# Altium footprint library ref-packages.PCBLIB: 1544 footprints (part 28 of 103)
Each footprint in its own frame and in the unit in brackets; x right, y up, seen from the top. Pads: shape width x height; smd on the part's side, far side on the other; paste and mask are expansions set on the pad; w line width, h text height; cw(c..) or ccw(c..) is an arc to the next point about the centre after c.
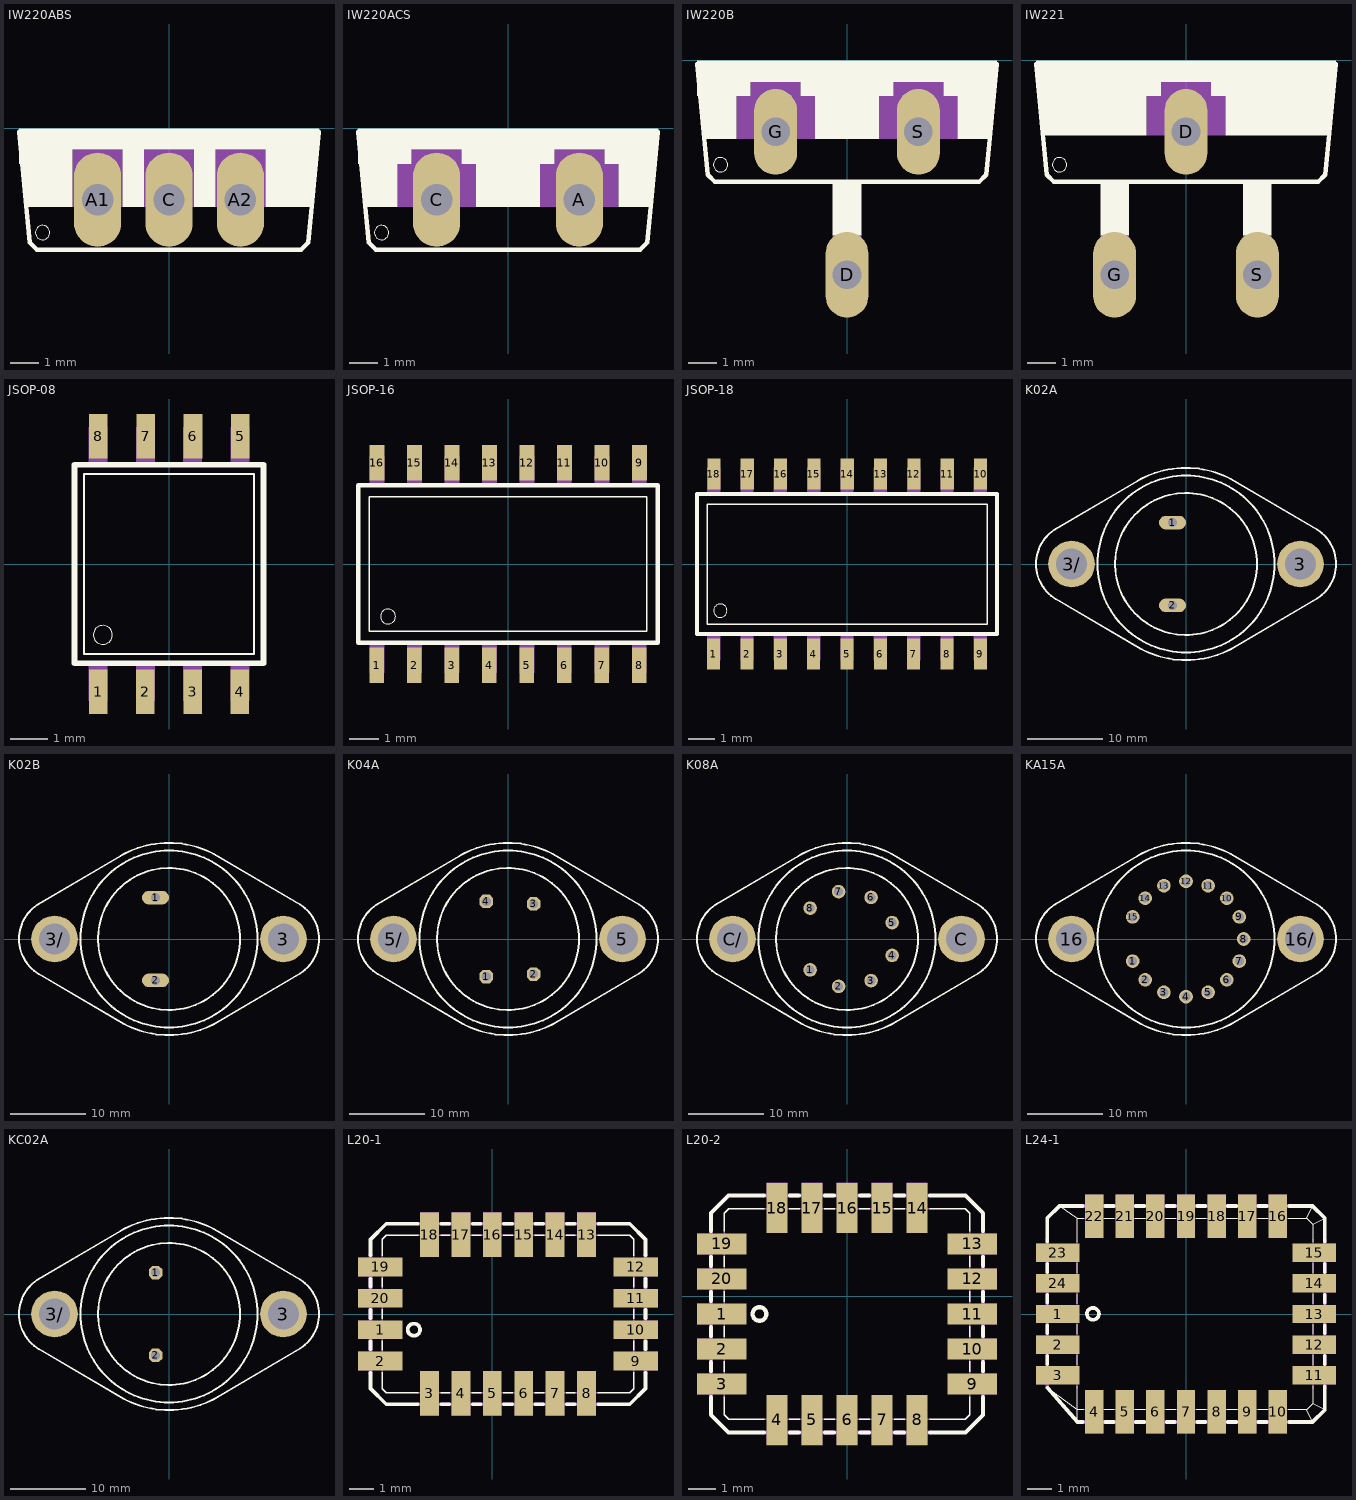
[diagram p27: the footprints below, top view; thin cyan lines are the x and y axes]

## IW220ABS [mil]
pads (3):
  oval 66x132 hole 44: A1(-100,-100) A2(100,-100) C(0,-100)
Top Overlay:
  circle w0: c-177,-146 r10
  rectangle: -210,-30 210,0
  rectangle: -210,-50 -135,-30
  rectangle: 135,-50 205,-30
  rectangle: 200,-75 205,-50
  rectangle: -205,-75 -200,-50
  rectangle: 135,-110 200,-50
  rectangle: 35,-110 65,-30
  rectangle: -65,-110 -35,-30
  rectangle: -200,-110 -135,-50
  lines w6: -210,-5 -195,-160 -185,-170 185,-170 195,-160 210,-5
Mechanical 16:
  rectangle: 65,-110 135,-30
  rectangle: -35,-110 35,-30
  rectangle: -135,-110 -65,-30

## IW220ACS [mil]
pads (2):
  oval 66x132 hole 44: A(100,-100) C(-100,-100)
Top Overlay:
  circle w0: c-177,-146 r10
  rectangle: -210,-30 210,0
  rectangle: -210,-50 -135,-30
  rectangle: -65,-50 65,-30
  rectangle: 155,-110 200,-50
  rectangle: 135,-50 205,-30
  rectangle: 200,-75 205,-50
  rectangle: -45,-110 45,-50
  rectangle: -200,-110 -155,-50
  rectangle: -205,-75 -200,-50
  lines w6: -210,-5 -195,-160 -185,-170 185,-170 195,-160 210,-5
Mechanical 16:
  rectangle: -135,-50 -65,-30
  rectangle: 65,-50 135,-30
  rectangle: 45,-110 155,-50
  rectangle: -155,-110 -45,-50

## IW220B [mil]
pads (3):
  oval 60x120 hole 40: D(0,-300) G(-100,-100) S(100,-100)
Top Overlay:
  circle w0: c-177,-146 r10
  rectangle: -210,-30 210,0
  rectangle: -210,-50 -135,-30
  rectangle: -20,-245 20,-170
  rectangle: -65,-50 65,-30
  rectangle: 155,-110 200,-50
  rectangle: 135,-50 205,-30
  rectangle: 200,-75 205,-50
  rectangle: -45,-110 45,-50
  rectangle: -200,-110 -155,-50
  rectangle: -205,-75 -200,-50
  lines w6: -210,-5 -195,-160 -185,-170 185,-170 195,-160 210,-5
Mechanical 16:
  rectangle: -135,-50 -65,-30
  rectangle: 65,-50 135,-30
  rectangle: -20,-300 20,-245
  rectangle: 45,-110 155,-50
  rectangle: -155,-110 -45,-50
  text "G" at -120,-160 h62
  text "D" at -15,-160 h62
  text "S" at 80,-160 h62

## IW221 [mil]
pads (3):
  oval 60x120 hole 40: D(0,-100) G(-100,-300) S(100,-300)
Top Overlay:
  circle w0: c-177,-146 r10
  rectangle: -210,-30 210,0
  rectangle: -120,-245 -80,-170
  rectangle: 80,-245 120,-170
  rectangle: 35,-50 205,-30
  rectangle: 55,-105 200,-50
  rectangle: -200,-105 -55,-50
  rectangle: -205,-50 -35,-30
  rectangle: 200,-80 205,-50
  rectangle: -205,-80 -200,-50
  lines w6: -210,-5 -195,-160 -185,-170 185,-170 195,-160 210,-5
Mechanical 16:
  rectangle: -35,-50 35,-30
  rectangle: -120,-300 -80,-245
  rectangle: 80,-300 120,-245
  rectangle: -55,-105 55,-50
  text "G" at -125,-160 h62
  text "D" at -15,-160 h62
  text "S" at 80,-160 h62

## JSOP-08 [mil]
pads (8):
  rect 19.69x47.24 smd: 1(-75,-135) 2(-25,-135) 3(25,-135) 4(75,-135) 5(75.32,135) 6(25.32,135) 7(-24.69,135) 8(-74.69,135)
Top Overlay:
  circle w0: c-70,-75 r10
  lines w2: -90,-95 90,-95 90,95 -90,95 -90,-95
  lines w6: -100,-105 -100,105 100,105 100,-105 -100,-105
Mechanical 16:
  rectangle: -85,105 -65,145
  rectangle: -35,105 -15,145
  rectangle: 15,105 35,145
  rectangle: 65,105 85,145
  rectangle: -85,-145 -65,-105
  rectangle: -35,-145 -15,-105
  rectangle: 15,-145 35,-105
  rectangle: 65,-145 85,-105

## JSOP-16 [mil]
pads (16):
  rect 19.69x47.24 smd: 1(-175,-135) 2(-125,-135) 3(-75,-135) 4(-25,-135) 5(25,-135) 6(75,-135) 7(125,-135) 8(175,-135) 9(175.32,135) 10(125.32,135) 11(75.32,135) 12(25.32,135) 13(-24.69,135) 14(-74.69,135) 15(-124.69,135) 16(-174.69,135)
Top Overlay:
  circle w0: c-160,-70 r10
  lines w2: -185,-90 185,-90 185,90 -185,90 -185,-90
  lines w6: -200,-105 -200,105 200,105 200,-105 -200,-105
Mechanical 16:
  rectangle: -185,105 -165,145
  rectangle: -135,105 -115,145
  rectangle: -85,105 -65,145
  rectangle: -35,105 -15,145
  rectangle: 15,105 35,145
  rectangle: 65,105 85,145
  rectangle: 115,105 135,145
  rectangle: 165,105 185,145
  rectangle: -185,-145 -165,-105
  rectangle: -135,-145 -115,-105
  rectangle: -85,-145 -65,-105
  rectangle: -35,-145 -15,-105
  rectangle: 15,-145 35,-105
  rectangle: 65,-145 85,-105
  rectangle: 115,-145 135,-105
  rectangle: 165,-145 185,-105

## JSOP-18 [mil]
pads (18):
  rect 19.69x47.24 smd: 1(-200,-135) 2(-150,-135) 3(-100,-135) 4(-50,-135) 5(0,-135) 6(50,-135) 7(100,-135) 8(150,-135) 9(200,-135) 10(200.32,135) 11(150.32,135) 12(100.32,135) 13(50.32,135) 14(0.32,135) 15(-49.69,135) 16(-99.69,135) 17(-149.69,135) 18(-199.69,135)
Top Overlay:
  circle w0: c-190,-70 r10
  lines w2: -210,-90 210,-90 210,90 -210,90 -210,-90
  lines w6: -225,-105 -225,105 225,105 225,-105 -225,-105
Mechanical 16:
  rectangle: -210,105 -190,145
  rectangle: -160,105 -140,145
  rectangle: -110,105 -90,145
  rectangle: -60,105 -40,145
  rectangle: -10,105 10,145
  rectangle: 40,105 60,145
  rectangle: 90,105 110,145
  rectangle: 140,105 160,145
  rectangle: 190,105 210,145
  rectangle: -210,-145 -190,-105
  rectangle: -160,-145 -140,-105
  rectangle: -110,-145 -90,-105
  rectangle: -60,-145 -40,-105
  rectangle: -10,-145 10,-105
  rectangle: 40,-145 60,-105
  rectangle: 90,-145 110,-105
  rectangle: 140,-145 160,-105
  rectangle: 190,-145 210,-105

## K02A [mil]
pads (4):
  oval 141x70.5 hole 47: 1(-70,215) 2(-70,-215)
  round 243 hole 162: 3(595,0) 3/(-595,0)
Top Overlay:
  circle w10: c0,0 r369
  circle w10: c0,0 r460
  lines w10: -680,180 -250,433 ; -679,-181 -234,-442 ; -675.41,-183.35 cw(c-567,0) -780,0 cw(c-567,0) -672.94,184.78 ; -250.86,432.52 cw(c-0.01,0) 0,500 cw(c0.01,-0.01) 235.3,441.18 ; -235.3,-441.18 ccw(c-0.01,0.01) 0,-500 ccw(c0.01,0) 250.86,-432.52 ; 235,441 684,178 ; 251,-433 684,-178 ; 682.54,-178.94 ccw(c567,0) 780,0 ccw(c567,0) 682.54,178.94
Mechanical 16:
  circle w10: c595,0 r85
  circle w10: c-595,0 r85

## K02B [mil]
pads (4):
  oval 141x70.5 hole 47: 1(-70,215) 2(-70,-215)
  round 243 hole 162: 3(595,0) 3/(-595,0)
Top Overlay:
  circle w10: c0,0 r369
  circle w10: c0,0 r460
  lines w10: -680,180 -250,433 ; -679,-181 -234,-442 ; -675.41,-183.35 cw(c-567,0) -780,0 cw(c-567,0) -672.94,184.78 ; -250.86,432.52 cw(c-0.01,0) 0,500 cw(c0.01,-0.01) 235.3,441.18 ; -235.3,-441.18 ccw(c-0.01,0.01) 0,-500 ccw(c0.01,0) 250.86,-432.52 ; 235,441 684,178 ; 251,-433 684,-178 ; 682.54,-178.94 ccw(c567,0) 780,0 ccw(c567,0) 682.54,178.94
Mechanical 16:
  circle w10: c595,0 r85
  circle w10: c-595,0 r85

## K04A [mil]
pads (6):
  oct 70.5x70.5 hole 47: 1(-113.17,-195.75) 2(132.8,-183) 3(132.8,183) 4(-113.17,195.75)
  round 243 hole 162: 5(595,0) 5/(-595,0)
Top Overlay:
  circle w10: c0,0 r369
  circle w10: c0,0 r460
  lines w10: -680,180 -250,433 ; -679,-181 -234,-442 ; -675.41,-183.35 cw(c-567,0) -780,0 cw(c-567,0) -672.94,184.78 ; -250.86,432.52 cw(c-0.01,0) 0,500 cw(c0.01,-0.01) 235.3,441.18 ; -235.3,-441.18 ccw(c-0.01,0.01) 0,-500 ccw(c0.01,0) 250.86,-432.52 ; 235,441 684,178 ; 251,-433 684,-178 ; 682.54,-178.94 ccw(c567,0) 780,0 ccw(c567,0) 682.54,178.94
Mechanical 16:
  circle w10: c595,0 r85
  circle w10: c-595,0 r85

## K08A [mil]
pads (10):
  round 70.5 hole 47: 1(-191.51,-160.7) 2(-43.41,-246.2) 3(125,-216.51) 4(234.92,-85.5) 5(234.92,85.5) 6(125,216.51) 7(-43.41,246.2) 8(-191.51,160.7)
  round 243 hole 162: C(595,0) C/(-595,0)
Top Overlay:
  circle w10: c0,0 r369
  circle w10: c0,0 r460
  lines w10: -680,180 -250,433 ; -679,-181 -234,-442 ; -675.41,-183.35 cw(c-567,0) -780,0 cw(c-567,0) -672.94,184.78 ; -250.86,432.52 cw(c-0.01,0) 0,500 cw(c0.01,-0.01) 235.3,441.18 ; -235.3,-441.18 ccw(c-0.01,0.01) 0,-500 ccw(c0.01,0) 250.86,-432.52 ; 235,441 684,178 ; 251,-433 684,-178 ; 682.54,-178.94 ccw(c567,0) 780,0 ccw(c567,0) 682.54,178.94
Mechanical 16:
  circle w6: c595,0 r85
  circle w6: c-595,0 r85

## KA15A [mil]
pads (17):
  round 70.86 hole 47.24: 1(-277.17,-114.8) 2(-212.13,-212.13) 3(-114.8,-277.17) 4(0,-300) 5(114.8,-277.17) 6(212.13,-212.13) 7(277.17,-114.8) 8(300,0) 9(277.17,114.8) 10(212.13,212.13) 11(114.8,277.17) 12(0,300) 13(-114.8,277.17) 14(-212.13,212.13) 15(-277.17,114.8)
  round 243 hole 162: 16(-595,0) 16/(595,0)
Top Overlay:
  circle w10: c0,0 r460
  lines w10: -680,180 -250,433 ; -679,-181 -234,-442 ; -675.41,-183.35 cw(c-567,0) -780,0 cw(c-567,0) -672.94,184.78 ; -250.86,432.52 cw(c-0.01,0) 0,500 cw(c0.01,-0.01) 235.3,441.18 ; -235.3,-441.18 ccw(c-0.01,0.01) 0,-500 ccw(c0.01,0) 250.86,-432.52 ; 235,441 684,178 ; 251,-433 684,-178 ; 682.54,-178.94 ccw(c567,0) 780,0 ccw(c567,0) 682.54,178.94
Mechanical 16:
  circle w6: c595,0 r85
  circle w6: c-595,0 r85

## KC02A [mil]
pads (4):
  oct 70.5x70.5 hole 47: 1(-70,215) 2(-70,-215)
  round 243 hole 162: 3(595,0) 3/(-595,0)
Top Overlay:
  circle w10: c0,0 r369
  circle w10: c0,0 r460
  lines w10: -680,180 -250,433 ; -679,-181 -234,-442 ; -675.41,-183.35 cw(c-567,0) -780,0 cw(c-567,0) -672.94,184.78 ; -250.86,432.52 cw(c-0.01,0) 0,500 cw(c0.01,-0.01) 235.3,441.18 ; -235.3,-441.18 ccw(c-0.01,0.01) 0,-500 ccw(c0.01,0) 250.86,-432.52 ; 235,441 684,178 ; 251,-433 684,-178 ; 682.54,-178.94 ccw(c567,0) 780,0 ccw(c567,0) 682.54,178.94
Mechanical 16:
  circle w10: c595,0 r85
  circle w10: c-595,0 r85

## L20-1 [mil]
pads (20):
  rect 70.87x29.92 smd: 1(-178.35,-25) 2(-178.35,-75) 9(228.35,-75) 10(228.35,-25) 11(228.35,25) 12(228.35,75) 19(-178.35,75) 20(-178.35,25)
  rect 29.92x70.87 smd: 3(-100,-125.98) 4(-50,-125.98) 5(0,-125.98) 6(50,-125.98) 7(100,-125.98) 8(150,-125.98) 13(150,125.98) 14(100,125.98) 15(50,125.98) 16(0,125.98) 17(-50,125.98) 18(-100,125.98)
Top Overlay:
  lines w2: -175,-92.64 -175,-118.74 -168.74,-125 -117.76,-125 ; -175,-57.36 -175,-42.64 ; -175,-7.36 -175,7.36 ; -175,42.64 -175,57.36 ; -175,92.64 -175,118.74 -168.74,125 -117.64,125 ; -82.36,-125 -67.64,-125 ; -82.36,125 -67.64,125 ; -32.36,-125 -17.64,-125 ; -32.36,125 -17.64,125 ; 17.64,-125 32.36,-125 ; 17.64,125 32.36,125 ; 67.64,-125 82.36,-125 ; 67.64,125 82.36,125 ; 117.64,-125 132.36,-125 ; 117.64,125 132.36,125 ; 167.64,-125 218.74,-125 225,-118.74 225,-92.64 ; 167.64,125 218.74,125 225,118.74 225,92.64 ; 225,-57.36 225,-42.64 ; 225,-7.36 225,7.36 ; 225,42.64 225,57.36
  lines w6: -193.74,-93.74 -193.74,-118.74 -168.74,-143.74 -118.74,-143.74 ; -193.74,-56.26 -193.74,-43.74 ; -193.74,-6.26 -193.75,6.25 ; -193.75,43.75 -193.75,56.25 ; -193.75,93.75 -193.75,118.75 -168.75,143.75 -118.75,143.75 ; -134.61,-25.16 cw(c-124.77,-25.16) -114.92,-25.16 ; -134.61,-24.84 ccw(c-124.77,-24.84) -114.92,-24.84 ; -81.26,-143.74 -68.74,-143.74 ; -81.25,143.75 -68.75,143.75 ; -31.26,-143.74 -18.74,-143.74 ; -31.25,143.75 -18.75,143.75 ; 18.75,-143.75 31.25,-143.75 ; 18.74,143.74 31.26,143.74 ; 68.75,-143.75 81.25,-143.75 ; 68.74,143.74 81.26,143.74 ; 118.75,-143.75 131.25,-143.75 ; 118.74,143.74 131.26,143.74 ; 168.75,-143.75 218.75,-143.75 243.75,-118.75 243.75,-93.75 ; 168.74,143.74 218.74,143.74 243.74,118.74 243.74,93.74 ; 243.75,-56.25 243.75,-43.75 ; 243.75,-6.25 243.74,6.26 ; 243.74,43.74 243.74,56.26
Mechanical 16:
  rectangle: -114.96,144.88 -85.04,162.6
  rectangle: -64.96,144.88 -35.04,162.6
  rectangle: -14.96,144.88 14.96,162.6
  rectangle: 35.04,144.88 64.96,162.6
  rectangle: 85.04,144.88 114.96,162.6
  rectangle: -114.96,-162.6 -85.04,-144.88
  rectangle: -64.96,-162.6 -35.04,-144.88
  rectangle: -14.96,-162.6 14.96,-144.88
  rectangle: 35.04,-162.6 64.96,-144.88
  rectangle: 85.04,-162.6 114.96,-144.88
  rectangle: 246.06,60.04 263.78,89.96
  rectangle: 246.06,10.04 263.78,39.96
  rectangle: 246.06,-39.96 263.78,-10.04
  rectangle: 246.06,-89.96 263.78,-60.04
  rectangle: -213.78,60.04 -196.06,89.96
  rectangle: -213.78,10.04 -196.06,39.96
  rectangle: -213.78,-39.96 -196.06,-10.04
  rectangle: -213.78,-89.96 -196.06,-60.04
  rectangle: 135.04,144.88 164.96,162.6
  rectangle: 135.04,-162.6 164.96,-144.88
  lines w2: -175,-93.74 -175,93.74 ; -118.74,-125 168.74,-125 ; -118.74,125 168.74,125 ; 225,-93.74 225,93.74
  lines w6: -193.74,-93.74 -193.75,93.75 ; -118.74,-143.74 168.75,-143.75 ; -118.75,143.75 168.74,143.74 ; 37.4,144.88 62.6,144.88 ; 87.4,144.88 112.6,144.88 ; 137.4,144.88 162.6,144.88 ; 243.75,-93.75 243.74,93.74

## L20-2 [mil]
pads (20):
  rect 70.87x29.92 smd: 1(-178.35,-25) 2(-178.35,-75) 3(-178.35,-125) 9(178.35,-125) 10(178.35,-75) 11(178.35,-25) 12(178.35,25) 13(178.35,75) 19(-178.35,75) 20(-178.35,25)
  rect 29.92x70.87 smd: 4(-100,-175.98) 5(-50,-175.98) 6(0,-175.98) 7(50,-175.98) 8(100,-175.98) 14(100,125.98) 15(50,125.98) 16(0,125.98) 17(-50,125.98) 18(-100,125.98)
Top Overlay:
  lines w2: -175,-142.64 -175,-168.74 -168.74,-175 -117.76,-175 ; -175,-107.36 -175,-92.64 ; -175,-57.36 -175,-42.64 ; -175,-7.36 -175,7.36 ; -175,42.64 -175,57.36 ; -175,92.64 -175,118.74 -168.74,125 -117.64,125 ; -82.36,-175 -67.64,-175 ; -82.36,125 -67.64,125 ; -32.36,-175 -17.64,-175 ; -32.36,125 -17.64,125 ; 17.64,-175 32.36,-175 ; 17.64,125 32.36,125 ; 67.64,-175 82.36,-175 ; 67.64,125 82.36,125 ; 117.64,-175 168.74,-175 175,-168.74 175,-142.64 ; 117.64,125 168.74,125 175,118.74 175,92.64 ; 175,-107.36 175,-92.64 ; 175,-57.36 175,-42.64 ; 175,-7.36 175,7.36 ; 175,42.64 175,57.36
  lines w6: -193.74,-143.74 -193.74,-168.74 -168.74,-193.74 -118.74,-193.74 ; -193.74,-106.26 -193.74,-93.74 ; -193.74,-56.26 -193.74,-43.74 ; -193.74,-6.26 -193.75,6.25 ; -193.75,43.75 -193.75,56.25 ; -193.75,93.75 -193.75,118.75 -168.75,143.75 -118.75,143.75 ; -134.61,-25.04 cw(c-124.61,-24.94) -134.61,-24.84 ; -114.92,-25.16 ccw(c-124.77,-25.1) -134.61,-24.84 ; -114.92,-24.92 cw(c-124.77,-24.88) -134.61,-24.84 ; -81.26,-193.74 -68.74,-193.74 ; -81.25,143.75 -68.75,143.75 ; -31.26,-193.74 -18.74,-193.74 ; -31.25,143.75 -18.75,143.75 ; 18.75,-193.75 31.25,-193.75 ; 18.74,143.74 31.26,143.74 ; 68.75,-193.75 81.25,-193.75 ; 68.74,143.74 81.26,143.74 ; 118.75,-193.75 168.75,-193.75 193.75,-168.75 193.75,-143.75 ; 118.74,143.74 168.74,143.74 193.74,118.74 193.74,93.74 ; 193.75,-106.25 193.75,-93.75 ; 193.75,-56.25 193.75,-43.75 ; 193.75,-6.25 193.74,6.26 ; 193.74,43.74 193.74,56.26
Mechanical 16:
  rectangle: -114.96,144.88 -85.04,162.6
  rectangle: -64.96,144.88 -35.04,162.6
  rectangle: -14.96,144.88 14.96,162.6
  rectangle: 35.04,144.88 64.96,162.6
  rectangle: 85.04,144.88 114.96,162.6
  rectangle: -114.96,-212.6 -85.04,-194.88
  rectangle: -64.96,-212.6 -35.04,-194.88
  rectangle: -14.96,-212.6 14.96,-194.88
  rectangle: 35.04,-212.6 64.96,-194.88
  rectangle: 85.04,-212.6 114.96,-194.88
  rectangle: 196.06,60.04 213.78,89.96
  rectangle: 196.06,10.04 213.78,39.96
  rectangle: 196.06,-39.96 213.78,-10.04
  rectangle: 196.06,-89.96 213.78,-60.04
  rectangle: -213.78,60.04 -196.06,89.96
  rectangle: -213.78,10.04 -196.06,39.96
  rectangle: -213.78,-39.96 -196.06,-10.04
  rectangle: -213.78,-89.96 -196.06,-60.04
  rectangle: -213.78,-89.96 -196.06,-60.04
  rectangle: 196.06,-139.96 213.78,-110.04
  rectangle: -213.78,-139.96 -196.06,-110.04
  lines w2: -175,-143.74 -175,93.74 ; -118.74,-175 118.74,-175 ; -118.74,125 118.74,125 ; 175,-143.74 175,93.74
  lines w6: -193.74,-143.74 -193.75,93.75 ; -118.74,-193.74 118.75,-193.75 ; -118.75,143.75 118.74,143.74 ; 37.4,144.88 62.6,144.88 ; 193.75,-143.75 193.74,93.74

## L24-1 [mil]
pads (24):
  rect 70.87x29.92 smd: 1(-209.45,0) 2(-209.45,-50) 3(-209.45,-100) 11(209.45,-100) 12(209.45,-50) 13(209.45,0) 14(209.45,50) 15(209.45,100) 23(-209.45,100) 24(-209.45,50)
  rect 29.92x70.87 smd: 4(-150,-159.45) 5(-100,-159.45) 6(-50,-159.45) 7(0,-159.45) 8(50,-159.45) 9(100,-159.45) 10(150,-159.45) 16(150,159.45) 17(100,159.45) 18(50,159.45) 19(0,159.45) 20(-50,159.45) 21(-100,159.45) 22(-150,159.45)
Top Overlay:
  lines w2: -226.34,-120.12 -177.17,-156.69 ; -206.69,176.38 -177.17,156.69 ; -177.17,-176.38 -177.17,-156.69 ; -177.17,-116.73 -177.17,-156.69 ; -177.17,-83.27 -177.17,-66.73 ; -177.17,-33.27 -177.17,-16.73 ; -177.17,16.73 -177.17,33.27 ; -177.17,66.73 -177.17,83.27 ; -177.17,116.73 -177.17,156.69 ; -166.73,-156.69 -177.17,-156.69 ; -166.73,156.69 -177.17,156.69 ; -133.27,-156.69 -116.73,-156.69 ; -133.27,156.69 -116.73,156.69 ; -83.27,-156.69 -66.73,-156.69 ; -83.27,156.69 -66.73,156.69 ; -33.27,-156.69 -16.73,-156.69 ; -33.27,156.69 -16.73,156.69 ; 16.73,-156.69 33.27,-156.69 ; 16.73,156.69 33.27,156.69 ; 66.73,-156.69 83.27,-156.69 ; 66.73,156.69 83.27,156.69 ; 116.73,-156.69 133.27,-156.69 ; 116.73,156.69 133.27,156.69 ; 166.73,-156.69 196.85,-156.69 ; 166.73,156.69 196.85,156.69 ; 206.69,-176.38 196.85,-156.69 ; 206.69,-116.73 206.69,-146.85 ; 206.69,-83.27 206.69,-66.73 ; 206.69,-33.27 206.69,-16.73 ; 206.69,16.73 206.69,33.27 ; 206.69,66.73 206.69,83.27 ; 206.69,116.73 206.69,146.85 ; 206.69,176.38 196.85,156.69 ; 226.38,-156.69 206.69,-146.85 ; 226.38,156.69 206.69,146.85 ; 196.85,-156.69 206.69,-146.85 ; 196.85,156.69 206.69,146.85
  lines w6: -226.38,-81.69 -226.38,-68.31 ; -226.38,-31.69 -226.38,-18.31 ; -226.38,18.31 -226.38,31.69 ; -226.38,68.31 -226.38,81.69 ; -226.38,118.31 -226.38,156.69 -206.69,176.38 -168.31,176.38 ; -226.18,-120.28 -177.17,-176.38 -168.31,-176.38 ; -161.81,0.16 cw(c-152.31,0.26) -161.81,0.35 ; -142.13,0.04 ccw(c-151.97,0.1) -161.81,0.35 ; -142.13,0.28 cw(c-151.97,0.32) -161.81,0.35 ; -131.69,-176.38 -118.31,-176.38 ; -131.69,176.38 -118.31,176.38 ; -81.69,-176.38 -68.31,-176.38 ; -81.69,176.38 -68.31,176.38 ; -31.69,-176.38 -18.31,-176.38 ; -31.69,176.38 -18.31,176.38 ; 18.31,-176.38 31.69,-176.38 ; 18.31,176.38 31.69,176.38 ; 68.31,-176.38 81.69,-176.38 ; 68.31,176.38 81.69,176.38 ; 118.31,-176.38 131.69,-176.38 ; 118.31,176.38 131.69,176.38 ; 168.31,-176.38 206.69,-176.38 226.38,-156.69 226.38,-118.31 ; 168.31,176.38 206.69,176.38 226.38,156.69 226.38,118.31 ; 226.38,-81.69 226.38,-68.31 ; 226.38,-31.69 226.38,-18.31 ; 226.38,18.31 226.38,31.69 ; 226.38,68.31 226.38,81.69
Mechanical 16:
  rectangle: -164.96,176.38 -135.04,194.88
  rectangle: -114.96,176.38 -85.04,194.88
  rectangle: -64.96,176.38 -35.04,194.88
  rectangle: -14.96,176.38 14.96,194.88
  rectangle: 35.04,176.38 64.96,194.88
  rectangle: 85.04,176.38 114.96,194.88
  rectangle: 135.04,176.38 164.96,194.88
  rectangle: 226.38,85.04 244.88,114.96
  rectangle: 226.38,35.04 244.88,64.96
  rectangle: 226.38,-14.96 244.88,14.96
  rectangle: 226.38,-64.96 244.88,-35.04
  rectangle: 226.38,-114.96 244.88,-85.04
  rectangle: -164.96,-194.88 -135.04,-176.38
  rectangle: -114.96,-194.88 -85.04,-176.38
  rectangle: -64.96,-194.88 -35.04,-176.38
  rectangle: -14.96,-194.88 14.96,-176.38
  rectangle: 35.04,-194.88 64.96,-176.38
  rectangle: 85.04,-194.88 114.96,-176.38
  rectangle: 135.04,-194.88 164.96,-176.38
  rectangle: -244.88,85.04 -226.38,114.96
  rectangle: -244.88,35.04 -226.38,64.96
  rectangle: -244.88,-14.96 -226.38,14.96
  rectangle: -244.88,-64.96 -226.38,-35.04
  rectangle: -244.88,-114.96 -226.38,-85.04
  lines w2: -177.17,-121.65 -177.17,119.88 ; -170.87,-156.69 171.85,-156.69 ; -170.71,156.69 171.85,156.69 ; 206.69,-121.85 206.69,121.85
  lines w6: -226.38,-119.96 -226.38,121.69 ; -171.69,176.38 171.69,176.38 ; -167.17,-176.38 166.69,-176.38 ; 226.38,-121.69 226.38,121.69